# Altium footprint library Maxwell_LIB.PcbLib: 143 footprints (part 8 of 9)
Each footprint in its own frame and in the unit in brackets; x right, y up, seen from the top. Pads: shape width x height; smd on the part's side, far side on the other; paste and mask are expansions set on the pad; w line width, h text height; cw(c..) or ccw(c..) is an arc to the next point about the centre after c.
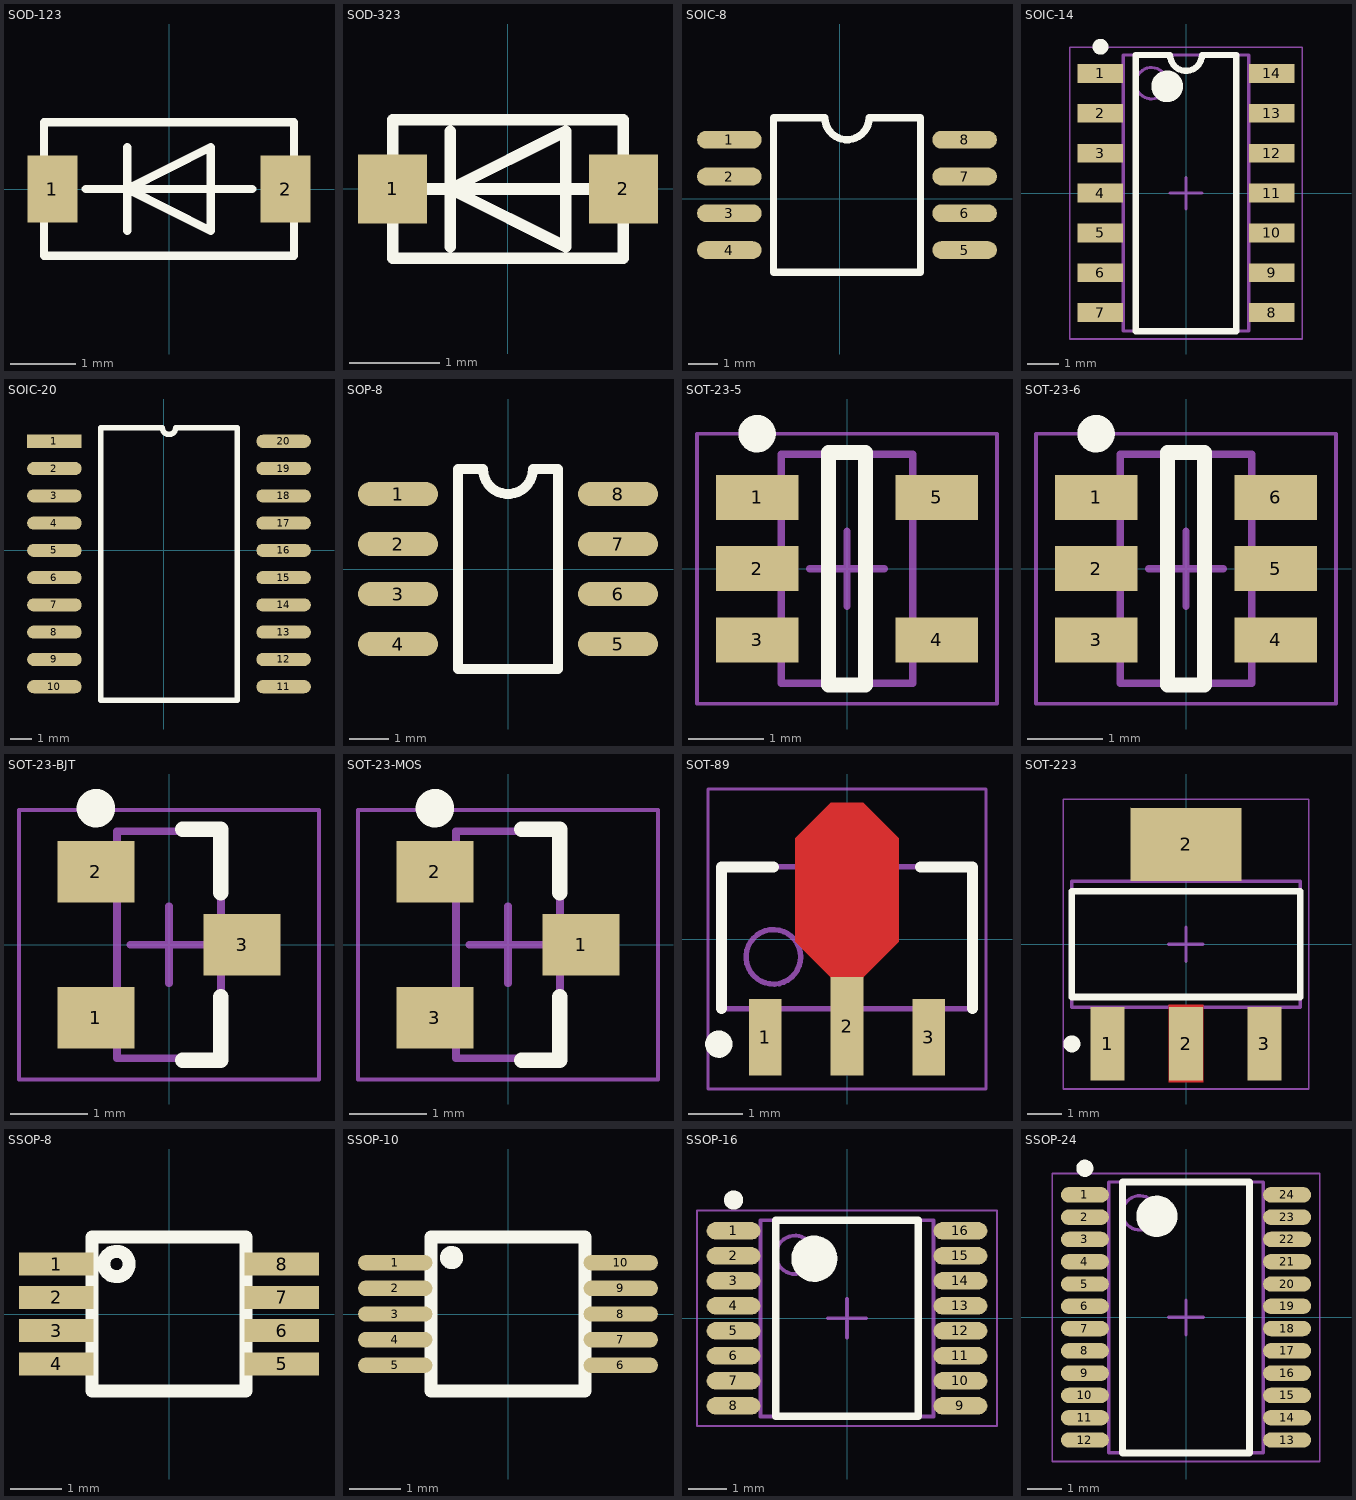
[diagram p7: the footprints below, top view; thin cyan lines are the x and y axes]

## SOD-123 [mil]
pads (2):
  rect 30x40 smd: 1(-70,0) 2(70,0)
Top Overlay:
  lines w5: -50,0 50,0 ; -25,-25 -25,25 ; -75,-40 75,-40 75,40 -75,40 -75,-40 ; -25,0 25,-25 25,25 -25,0
3D body "User Library-SOD123-1.STEP": height 46.46, standoff 0, extent -76.76,-35.43 76.78,35.44

## SOD-323 [mil]
pads (2):
  rect 30x30 smd: 1(-50,0) 2(50,0)
Top Overlay:
  lines w5: -35,0 35,0 ; -25,-25 -25,25 ; -50,-30 -50,30 50,30 50,-30 -50,-30 ; -25,0 25,25 25,-25 -25,0
3D body "User Library-SOD323-1.STEP": height 43.31, standoff 0, extent -51.17,-26.57 51.19,26.58

## SOIC-8 [mil]
pads (8):
  oval 88x24 smd: 1(-150,80) 2(-150,30) 3(-150,-20) 4(-150,-70) 5(170,-70) 6(170,-20) 7(170,30) 8(170,80)
Top Overlay:
  lines w10: -90,-100 110,-100 110,110 40,110 cw(c10,110) -20,110 -90,110 -90,-100
3D body "SW3dPS-SOIC8_(ATTINY12).STEP": height 90.55, standoff -0.78, extent -155.2,-100.9 175.21,110.91

## SOIC-14 [mm] "SOIC, 14-Leads, Body 8.65x3.90mm, Pitch 1.27mm, IPC Medium Density"
height 1.75
pads (14):
  rect 1.45x0.6 smd: 1(-2.725,3.81) 2(-2.725,2.54) 3(-2.725,1.27) 4(-2.725,0) 5(-2.725,-1.27) 6(-2.725,-2.54) 7(-2.725,-3.81) 8(2.725,-3.81) 9(2.725,-2.54) 10(2.725,-1.27) 11(2.725,0) 12(2.725,1.27) 13(2.725,2.54) 14(2.725,3.81)
Top Overlay:
  circle w0.25: c-2.725,4.66 r0.125
  circle w0.5: c-0.6,3.4 r0.254
  lines w0.2: -1.6,4.4 -1.6,-4.4 1.6,-4.4 1.6,4.4 0.508,4.4 cw(c0,4.4) -0.508,4.4 -1.575,4.4
Mechanical 13:
  circle w0.1: c-1.1,3.5 r0.5
  lines w0.1: -2,-4.4 -2,4.4 2,4.4 2,-4.4 -2,-4.4
Mechanical 15:
  lines w0.05: -3.7,-4.65 -3.7,4.65 3.7,4.65 3.7,-4.65 -3.7,-4.65
  lines w0.1: -0.5,0 0.5,0 ; 0,-0.5 0,0.5
3D body "SOIC14.STEP": height 1.75, standoff 0, extent -3.127,-4.35 2.873,4.4

## SOIC-20 [mil]
pads (20):
  rect 100x24 smd: 1(-200,200)
  oval 100x24 smd: 2(-200,150) 3(-200,100) 4(-200,50) 5(-200,0) 6(-200,-50) 7(-200,-100) 8(-200,-150) 9(-200,-200) 10(-200,-250) 11(220,-250) 12(220,-200) 13(220,-150) 14(220,-100) 15(220,-50) 16(220,0) 17(220,50) 18(220,100) 19(220,150) 20(220,200)
Top Overlay:
  lines w10: -115,-275 135,-275 135,225 22.5,225 cw(c10,225) -2.5,225 -115,225 -115,-275
3D body "User Library-SOIC-20-300.STEP": height 101.38, standoff -0.98, extent -198.66,-280.9 218.66,230.91

## SOP-8 [mil]
height 39.37
pads (8):
  oval 80x24 smd: 1(-110,75) 2(-110,25) 3(-110,-25) 4(-110,-75) 5(110,-75) 6(110,-25) 7(110,25) 8(110,75)
Top Overlay:
  lines w10: -50,-100 -50,100 -25,100 ccw(c0,100) 25,100 50,100 50,-100 -50,-100
3D body "User Library-so-8.step": height 73.87, standoff -1.02, extent -124.77,-98.25 124.78,98.75

## SOT-23-5 [mm] "SOT23, 5-Leads, Body 2.90x2.80mm, Pitch 0.95mm, IPC Medium Density"
height 1.45
pads (5):
  rect 1.1x0.6 smd: 1(-1.2,0.95) 2(-1.2,0) 3(-1.2,-0.95) 4(1.2,-0.95) 5(1.2,0.95)
Top Overlay:
  circle w0.25: c-1.2,1.8 r0.125
  lines w0.2: -0.25,-1.55 -0.25,1.55 0.25,1.55 0.25,-1.55 -0.25,-1.55
Mechanical 13:
  lines w0.1: -0.875,-1.525 0.875,-1.525 0.875,1.525 -0.875,1.525 -0.875,-1.525
Mechanical 15:
  lines w0.05: -2,-1.8 2,-1.8 2,1.8 -2,1.8 -2,-1.8
  lines w0.1: -0.5,0 0.5,0 ; 0,-0.5 0,0.5
3D body "CircuitWorks-SOT-23-5.STEP": height 1.05, standoff -0.05, extent -1.25,-1.525 1.25,1.475

## SOT-23-6 [mm] "SOT23, 6-Leads, Body 2.90x2.80mm, Pitch 0.95mm, IPC Medium Density"
height 1.45
pads (6):
  rect 1.1x0.6 smd: 1(-1.2,0.95) 2(-1.2,0) 3(-1.2,-0.95) 4(1.2,-0.95) 5(1.2,0) 6(1.2,0.95)
Top Overlay:
  circle w0.25: c-1.2,1.8 r0.125
  lines w0.2: -0.25,-1.55 -0.25,1.55 0.25,1.55 0.25,-1.55 -0.25,-1.55
Mechanical 13:
  lines w0.1: -0.875,-1.525 0.875,-1.525 0.875,1.525 -0.875,1.525 -0.875,-1.525
Mechanical 15:
  lines w0.05: -2,-1.8 2,-1.8 2,1.8 -2,1.8 -2,-1.8
  lines w0.1: -0.5,0 0.5,0 ; 0,-0.5 0,0.5
3D body "User Library-SOT23-6.STEP": height 1.3, standoff 0, extent -1.5,-1.5 1.5,1.5

## SOT-23-BJT [mm] "SOT23, 3-Leads, Body 2.90x2.45mm, Pitch 0.95mm, IPC Medium Density"
height 1.1
pads (3):
  rect 1x0.8 smd: 1(-0.95,-0.95) 2(-0.95,0.95) 3(0.95,0)
Top Overlay:
  circle w0.25: c-0.95,1.775 r0.125
  lines w0.2: 0.175,-1.5 0.675,-1.5 0.675,-0.675 ; 0.175,1.5 0.675,1.5 0.675,0.675
Mechanical 13:
  lines w0.1: -0.675,-1.475 -0.675,1.475 0.675,1.475 0.675,-1.475 -0.675,-1.475
Mechanical 15:
  lines w0.05: -1.95,-1.75 -1.95,1.75 1.95,1.75 1.95,-1.75 -1.95,-1.75
  lines w0.1: -0.5,0 0.5,0 ; 0,-0.5 0,0.5
3D body "SOT-23.STEP": height 1.05, standoff -0.05, extent -1.403,-1.5 1.097,1.5

## SOT-23-MOS [mm] "SOT23, 3-Leads, Body 2.90x2.45mm, Pitch 0.95mm, IPC Medium Density"
height 1.1
pads (3):
  rect 1x0.8 smd: 1(0.95,0) 2(-0.95,0.95) 3(-0.95,-0.95)
Top Overlay:
  circle w0.25: c-0.95,1.775 r0.125
  lines w0.2: 0.175,-1.5 0.675,-1.5 0.675,-0.675 ; 0.175,1.5 0.675,1.5 0.675,0.675
Mechanical 13:
  lines w0.1: -0.675,-1.475 -0.675,1.475 0.675,1.475 0.675,-1.475 -0.675,-1.475
Mechanical 15:
  lines w0.05: -1.95,-1.75 -1.95,1.75 1.95,1.75 1.95,-1.75 -1.95,-1.75
  lines w0.1: -0.5,0 0.5,0 ; 0,-0.5 0,0.5
3D body "SOT-23.STEP": height 1.05, standoff -0.05, extent -1.326,-1.474 1.174,1.526

## SOT-89 [mm] "SOT89, 3-Leads, Body 4.50x2.45mm, Pitch 1.50mm, Lead Span 4.1mm, IPC Medium Density"
height 1.6
pads (3):
  rect 0.6x1.4 smd: 1(-1.5,-1.8) 3(1.5,-1.8)
  rect 0.6x1.8 smd: 2(0,-1.6)
Top Layer:
  region: -0.3,-0.7 -0.95,-0.05 -0.95,1.85 -0.638,2.162 -0.3,2.5 0.3,2.5 0.95,1.85 0.95,-0.05 0.3,-0.7
Top Overlay:
  circle w0.25: c-2.35,-1.927 r0.125
  lines w0.2: -2.3,-1.278 -2.3,1.322 -1.35,1.322 ; 1.35,1.322 2.3,1.322 2.3,-1.278
Mechanical 13:
  circle w0.1: c-1.35,-0.327 r0.5
  lines w0.1: -2.3,-1.278 -2.3,1.322 2.3,1.322 2.3,-1.278 -2.3,-1.278
Mechanical 15:
  lines w0.05: -2.55,-2.75 -2.55,2.75 2.55,2.75 2.55,-2.75 -2.55,-2.75
  lines w0.1: -0.5,0.022 0.5,0.022 ; 0,-0.477 0,0.523
3D body "User Library-SOT-89-1.STEP": height 1.51, standoff 0, extent -2.25,-2.032 2.25,2.268

## SOT-223 [mm]
pads (4):
  rect 1x2.15 smd: 1(-2.3,-2.925) 2(0,-2.925) 3(2.3,-2.925)
  rect 3.25x2.15 smd: 2(0,2.925)
Top Layer:
  rectangle: -0.508,-4.064 0.508,-1.778
Top Overlay:
  circle w0.25: c-3.35,-2.925 r0.125
  lines w0.2: -3.35,-1.55 -3.35,1.55 3.35,1.55 3.35,-1.55 -3.35,-1.55
Mechanical 13:
  lines w0.1: -3.35,-1.85 -3.35,1.85 3.35,1.85 3.35,-1.85 -3.35,-1.85
Mechanical 15:
  lines w0.05: -3.6,-4.25 -3.6,4.25 3.6,4.25 3.6,-4.25 -3.6,-4.25
  lines w0.1: -0.5,0 0.5,0 ; 0,-0.5 0,0.5
3D body "AMS1117.STEP": height 1.84, standoff -0.03, extent -3.254,-3.602 3.251,3.398

## SSOP-8 [mm]
pads (8):
  rect 1.45x0.45 smd paste+0: 1(-2.2,0.975) 2(-2.2,0.325) 3(-2.2,-0.325) 4(-2.2,-0.975) 5(2.2,-0.975) 6(2.2,-0.325) 7(2.2,0.325) 8(2.2,0.975)
Top Overlay:
  circle w0.254: c-1.025,0.975 r0.247
  lines w0.254: -1.5,-1.5 -1.5,1.5 1.5,1.5 1.5,-1.5 -1.5,-1.5
3D body "User Library-VSSOP8 3x3 e0_65-1.STEP": height 1.1, standoff 0, extent -2.526,-1.551 2.474,1.449

## SSOP-10 [mm]
pads (10):
  oval 1.45x0.3 smd: 1(-2.2,1) 2(-2.2,0.5) 3(-2.2,0) 4(-2.2,-0.5) 5(-2.2,-1) 6(2.2,-1) 7(2.2,-0.5) 8(2.2,0) 9(2.2,0.5) 10(2.2,1)
Top Overlay:
  circle w0.254: c-1.1,1.1 r0.1
  lines w0.254: -1.5,-1.5 1.5,-1.5 1.5,1.5 -1.5,1.5 -1.5,-1.5
3D body "VSSOP10.STEP": height 1.1, standoff 0, extent -2.488,-1.526 2.437,1.474

## SSOP-16 [mm] "TSOP, 16-Leads, Body 5.00x4.40mm, Pitch 0.65mm, IPC Medium Density"
height 1
pads (16):
  oval 1.4x0.45 smd: 1(-2.95,2.275) 2(-2.95,1.625) 3(-2.95,0.975) 4(-2.95,0.325) 5(-2.95,-0.325) 6(-2.95,-0.975) 7(-2.95,-1.625) 8(-2.95,-2.275) 9(2.95,-2.275) 10(2.95,-1.625) 11(2.95,-0.975) 12(2.95,-0.325) 13(2.95,0.325) 14(2.95,0.975) 15(2.95,1.625) 16(2.95,2.275)
Top Overlay:
  circle w0.25: c-2.95,3.075 r0.125
  circle w0.6: c-0.85,1.55 r0.3
  lines w0.2: -1.85,-2.55 -1.85,2.55 1.85,2.55 1.85,-2.55 -1.85,-2.55
Mechanical 13:
  circle w0.1: c-1.35,1.65 r0.5
  lines w0.1: -2.25,-2.55 -2.25,2.55 2.25,2.55 2.25,-2.55 -2.25,-2.55
Mechanical 15:
  lines w0.05: -3.9,-2.8 -3.9,2.8 3.9,2.8 3.9,-2.8 -3.9,-2.8
  lines w0.1: -0.5,0 0.5,0 ; 0,-0.5 0,0.5
3D body "User Library-TSSOP-16-1.STEP": height 1.1, standoff 0, extent -3.2,-2.5 3.2,2.5

## SSOP-24 [mm] "TSOP, 24-Leads, Body 7.45x4.40mm, Pitch 0.65mm, IPC Medium Density"
height 1
pads (24):
  oval 1.4x0.45 smd: 1(-2.95,3.575) 2(-2.95,2.925) 3(-2.95,2.275) 4(-2.95,1.625) 5(-2.95,0.975) 6(-2.95,0.325) 7(-2.95,-0.325) 8(-2.95,-0.975) 9(-2.95,-1.625) 10(-2.95,-2.275) 11(-2.95,-2.925) 12(-2.95,-3.575) 13(2.95,-3.575) 14(2.95,-2.925) 15(2.95,-2.275) 16(2.95,-1.625) 17(2.95,-0.975) 18(2.95,-0.325) 19(2.95,0.325) 20(2.95,0.975) 21(2.95,1.625) 22(2.95,2.275) 23(2.95,2.925) 24(2.95,3.575)
Top Overlay:
  circle w0.6: c-0.85,2.95 r0.3
  circle w0.25: c-2.95,4.35 r0.125
  lines w0.2: -1.85,-3.95 1.85,-3.95 1.85,3.95 -1.85,3.95 -1.85,-3.95
Mechanical 13:
  circle w0.1: c-1.35,3.05 r0.5
  lines w0.1: -2.25,-3.95 2.25,-3.95 2.25,3.95 -2.25,3.95 -2.25,-3.95
Mechanical 15:
  lines w0.05: -3.9,-4.2 3.9,-4.2 3.9,4.2 -3.9,4.2 -3.9,-4.2
  lines w0.1: -0.5,0 0.5,0 ; 0,-0.5 0,0.5
3D body "TSSOP-24.STEP": height 1.2, standoff 0, extent -3.2,-3.875 3.2,3.925